# Altium footprint library 传感器和模块.PcbLib: 24 footprints (part 1 of 2)
Each footprint in its own frame and in the unit in brackets; x right, y up, seen from the top. Pads: shape width x height; smd on the part's side, far side on the other; paste and mask are expansions set on the pad; w line width, h text height; cw(c..) or ccw(c..) is an arc to the next point about the centre after c.
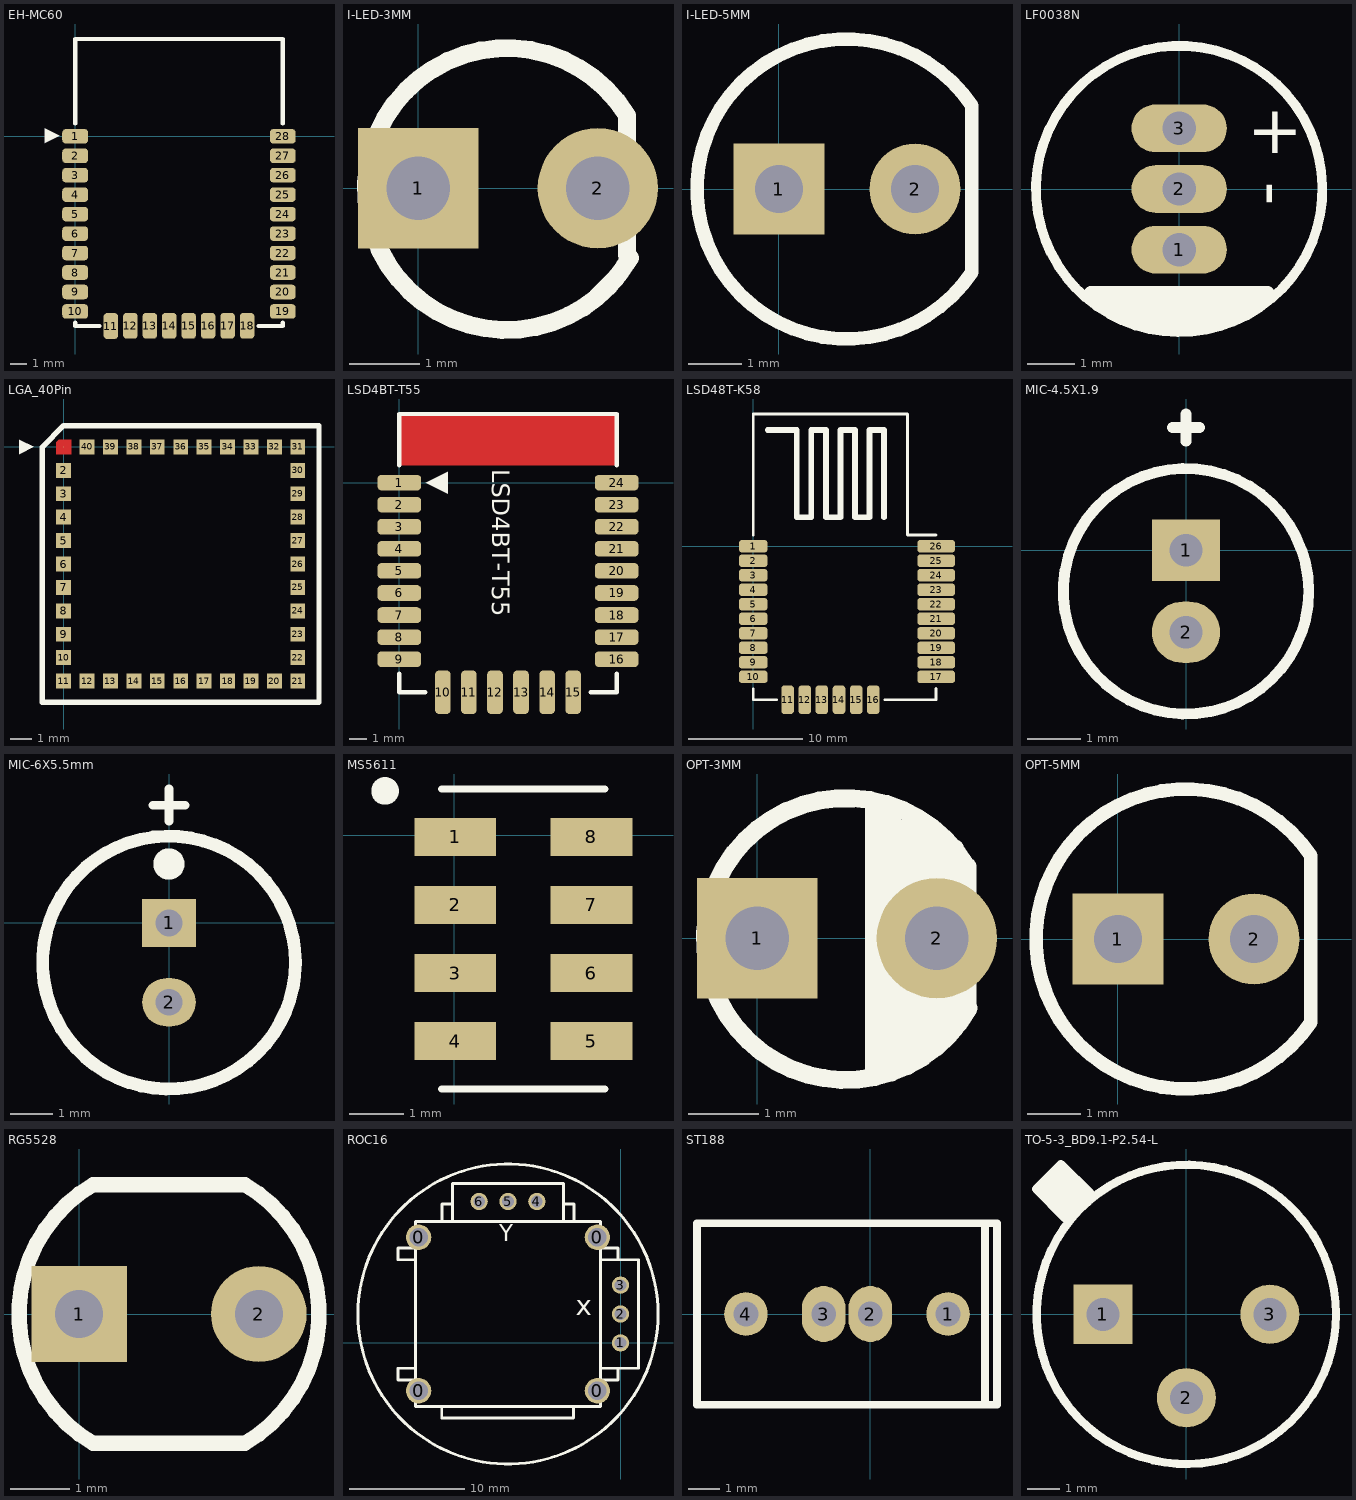
[diagram p0: the footprints below, top view; thin cyan lines are the x and y axes]

## EH-MC60 [mm]
pads (28):
  rrect50% 1.6x0.9 smd: 1(0,0) 2(0,-1.2) 3(0,-2.4) 4(0,-3.6) 5(0,-4.8) 6(0,-6) 7(0,-7.2) 8(0,-8.4) 9(0,-9.6) 10(0,-10.8) 19(12.8,-10.8) 20(12.8,-9.6) 21(12.8,-8.4) 22(12.8,-7.2) 23(12.8,-6) 24(12.8,-4.8) 25(12.8,-3.6) 26(12.8,-2.4) 27(12.8,-1.2) 28(12.8,0)
  rrect50% 0.9x1.6 smd: 11(2.2,-11.7) 12(3.4,-11.684) 13(4.6,-11.684) 14(5.8,-11.684) 15(7,-11.684) 16(8.2,-11.684) 17(9.4,-11.684) 18(10.6,-11.684)
Top Overlay:
  lines w0.254: 0,-11.5 0,-11.7 1.5,-11.7 ; 0,0.8 0,6 12.8,6 12.8,0.8 ; 11.3,-11.7 12.8,-11.7 12.8,-11.5
  text "▲" at -2.032,0.508 h1.52

## I-LED-3MM [mm]
pads (2):
  rect 1.7x1.7 hole 0.9: 1(0,0)
  round 1.7 hole 0.9: 2(2.54,0)
Top Overlay:
  lines w0.254: 2.54,-1.524 2.794,-1.27 ; 2.955,-0.947 2.955,1.025 ccw(c1.254,-0.012) 2.992,-0.985

## I-LED-5MM [mm]
pads (2):
  rect 1.7x1.7 hole 0.9: 1(0,0)
  round 1.7 hole 0.9: 2(2.54,0)
Top Overlay:
  lines w0.254: 3.6,-1.553 cw(c1.27,0) 3.6,1.553 3.6,-1.553

## LF0038N [mm] "脚距1.27mm"
pads (3):
  oval 2x1 hole 0.7: 1(0,-1.27) 2(0,0) 3(0,1.27)
Top Overlay:
  lines w0.203: 1.66,-2.499 cw(c0,0) 1.69,-2.479
  lines w0.254: -1.854,-2.311 1.854,-2.311 1.854,-2.159 -1.854,-2.159 -1.854,-2.311 ; -1.6,-2.489 1.524,-2.489 1.524,-2.413 -1.6,-2.413 -1.6,-2.489 ; -1.194,-2.667 1.194,-2.667 1.194,-2.616 -1.194,-2.616 -1.194,-2.667 ; -0.762,-2.819 0.711,-2.819 0.711,-2.743 -0.762,-2.743 -0.762,-2.819
  text "-" at 2.269,-0.356 h1.02
  text "+" at 1.422,0.745 h1.02

## LGA_40Pin [mm]
pads (41):
  round 0.025 smd: 1(0,0)
  rect 0.7x0.7 smd: 2(0,-1.1) 3(0,-2.2) 4(0,-3.3) 5(0,-4.4) 6(0,-5.5) 7(0,-6.6) 8(0,-7.7) 9(0,-8.8) 10(0,-9.9) 11(0,-11) 12(1.1,-11) 13(2.2,-11) 14(3.3,-11) 15(4.4,-11) 16(5.5,-11) 17(6.6,-11) 18(7.7,-11) 19(8.8,-11) 20(9.9,-11) 21(11,-11) 22(11,-9.9) 23(11,-8.8) 24(11,-7.7) 25(11,-6.6) 26(11,-5.5) 27(11,-4.4) 28(11,-3.3) 29(11,-2.2) 30(11,-1.1) 31(11,0) 32(9.9,0) 33(8.8,0) 34(7.7,0) 35(6.6,0) 36(5.5,0) 37(4.4,0) 38(3.3,0) 39(2.2,0) 40(1.1,0)
  round 0.025 on Top Overlay mask+0.102: ""(-1.75,0)
Top Layer:
  region: -0.35,-0.35 -0.35,0.225 -0.225,0.35 0.35,0.35 0.35,-0.35
Top Overlay:
  region: -2.1,0.35 -2.1,-0.35 -1.4,0
  lines w0.254: -1,-12 -1,0 0,1 12,1 12,-12 -1,-12

## LSD4BT-T55 [mm]
pads (24):
  rrect50% 2.5x0.9 smd: 1(0,0) 2(0,-1.27) 3(0,-2.54) 4(0,-3.81) 5(0,-5.08) 6(0,-6.35) 7(0,-7.62) 8(0,-8.89) 9(0,-10.16) 16(12.5,-10.16) 17(12.5,-8.89) 18(12.5,-7.62) 19(12.5,-6.35) 20(12.5,-5.08) 21(12.5,-3.81) 22(12.5,-2.54) 23(12.5,-1.27) 24(12.5,0)
  rrect50% 0.9x2.5 smd: 10(2.5,-12.06) 11(4,-12.06) 12(5.5,-12.06) 13(7,-12.06) 14(8.5,-12.06) 15(10,-12.06)
Top Layer:
  pour cut-out: 0,3.945 0,1 12.5,1 12.5,3.945
Top Overlay:
  region: 1.524,0 2.794,-0.635 2.794,0.635
  lines w0.254: 0,-11 0,-12.06 1.5,-12.06 ; 0,1 0,3.945 12.5,3.945 12.5,1 ; 11,-12.055 12.5,-12.055 12.5,-11
  text "." at -1.524,0.508 h1.02
  text "LSD4BT-T55" at 5.334,0.762 h1.02

## LSD48T-K58 [mm]
pads (26):
  rrect50% 2.5x1.1 smd: 1(0,0) 2(0,-1.27) 3(0,-2.54) 4(0,-3.81) 5(0,-5.08) 6(0,-6.35) 7(0,-7.62) 8(0,-8.89) 9(0,-10.16) 10(0,-11.43)
  rrect50% 1.1x2.5 smd: 11(3,-13.43) 12(4.5,-13.43) 13(6,-13.43) 14(7.5,-13.43) 15(9,-13.43) 16(10.5,-13.43)
  rrect50% 3.3x1.1 smd: 17(16,-11.43) 18(16,-10.16) 19(16,-8.89) 20(16,-7.62) 21(16,-6.35) 22(16,-5.08) 23(16,-3.81) 24(16,-2.54) 25(16,-1.27) 26(16,0)
Top Overlay:
  lines w0.254: 0,-12.5 0,-13.43 2.032,-13.43 ; 0,1 0,11.57 13.5,11.57 13.5,1 16,1 ; 11.5,-13.43 16,-13.43 16,-12.448
  lines w0.508: 1.27,10.16 3.81,10.16 3.81,2.54 5.08,2.54 5.08,10.16 6.35,10.16 6.35,2.54 7.62,2.54 7.62,10.16 8.89,10.16 8.89,2.54 10.16,2.54 10.16,10.16 11.43,10.16 11.43,2.54

## MIC-4.5X1.9 [mil]
pads (2):
  rect 50x45 hole 24: 1(0,0)
  oval 50x45 hole 24: 2(0,-60)
Top Overlay:
  circle w8: c0,-30 r90
  lines w8: -10,90 10,90 ; 0,80 0,100
3D body "MIC4.5X1.9.STEP": height 75.38, standoff -110.24, extent -88.58,-117.17 88.58,60

## MIC-6X5.5mm [mil]
pads (2):
  rect 50x45 hole 25: 1(0,0)
  oval 50x45 hole 25: 2(0,-74)
Top Overlay:
  circle w12: c0,-37 r118
  circle w15: c0,55 r7.07
  lines w8: -15,110 15,110 ; 0,95 0,125
3D body "MIC6X5.5.STEP": height 197.64, standoff -118.11, extent -120,-153.11 116.22,83.11

## MS5611 [mm]
pads (8):
  rect 1.5x0.7 smd: 1(0.02,-0.03) 2(0.02,-1.28) 3(0.02,-2.53) 4(0.02,-3.78) 5(2.52,-3.78) 6(2.52,-2.53) 7(2.52,-1.28) 8(2.52,-0.03)
Top Overlay:
  circle w0.454: c-1.27,0.813 r0.025
  lines w0.127: -0.23,-4.659 2.77,-4.659 ; -0.23,0.849 2.77,0.849
3D body "SM5611-.STEP": height 1, standoff -0.01, extent -0.23,-4.492 2.77,0.508

## OPT-3MM [mm]
pads (2):
  rect 1.7x1.7 hole 0.9: 1(0,0)
  round 1.7 hole 0.9: 2(2.54,0)
Top Overlay:
  lines w0.254: 1.651,-1.905 1.651,1.905 ; 1.905,-1.778 1.905,1.778 ; 2.286,-1.651 2.286,1.524 ; 2.794,1.27 2.794,-1.27 2.54,-1.524 2.54,1.397 2.413,1.524 2.286,1.524 ; 2.955,1.025 ccw(c1.254,-0.012) 2.99,-0.987 ; 2.972,-0.965 2.972,1.016 ; 2.159,1.651 2.159,-1.778 2.159,1.651 ; 2.159,1.651 2.286,1.524

## OPT-5MM [mm]
pads (2):
  rect 1.7x1.7 hole 0.9: 1(0,0)
  round 1.7 hole 0.9: 2(2.54,0)
Top Overlay:
  lines w0.254: 3.6,-1.553 cw(c1.27,0) 3.6,1.553 3.6,-1.553

## RG5528 [mm]
pads (2):
  rect 1.6x1.6 hole 0.8: 1(0,0)
  round 1.6 hole 0.8: 2(3,0)
Top Overlay:
  lines w0.254: 0.23,-2.159 cw(c1.5,0) 0.23,2.159 2.77,2.159 cw(c1.5,0) 2.77,-2.159 0.23,-2.159
3D body "RG5528-.STEP": height 1.9, standoff -3.45, extent -1,-2.159 4,2.141

## ROC16 [mm]
pads (10):
  round 2.2 hole 1.6: 0(-17.5,-4.15) 0(-17.5,9.15) 0(-2,-4.15) 0(-2,9.15)
  round 1.5 hole 1: 1(0,0) 2(0,2.5) 3(0,5) 4(-7.25,12.25) 5(-9.75,12.25) 6(-12.25,12.25)
Top Overlay:
  circle w0.254: c-9.75,2.5 r13
  lines w0.254: -17.75,-3.215 -19.275,-3.215 -19.275,-2.199 -17.75,-2.199 ; -17.75,7.199 -19.275,7.199 -19.275,8.215 -17.75,8.215 ; -15.491,-5.528 -15.491,-6.517 -4.061,-6.517 -4.061,-5.527 -4.087,-5.553 ; -15.465,10.5 -15.465,12.025 -14.55,12.025 ; -14.55,10.5 -14.55,13.8 -4.95,13.8 -4.95,10.5 ; -4.95,11.644 -4.95,10.5 ; -4.95,12.025 -4.035,12.025 -4.035,10.5 ; -4.924,10.526 -4.95,10.5 ; -1.75,-3.215 -0.225,-3.215 -0.225,-2.199 ; -1.75,-2.199 -0.225,-2.199 ; -1.75,7.199 -0.225,7.199 ; -1.75,8.215 -0.225,8.215 -0.225,7.199 ; -0.225,-2.199 1.55,-2.199 1.551,0.075 ; -0.225,7.199 1.553,7.199 1.552,4.824 1.551,0.075 ; 1.551,0.075 1.551,0.075 ; -17.75,-5.5 -17.75,10.5 -1.75,10.5 -1.75,-5.5 -17.75,-5.5
  text "Y" at -10.512,8.342 h2.5
  text "x" at -3.883,1.763 h3
3D body "ROC16-.STEP": height 29.36, standoff -3.65, extent -22.25,-10.054 2.75,14.946

## ST188 [mm]
pads (4):
  round 1.4 hole 0.8: 1(2.5,0) 4(-4,0)
  oval 1.4x1.8 hole 0.8: 2(0,0) 3(-1.5,0)
Top Overlay:
  lines w0.254: 3.695,-2.921 3.695,2.921 ; -5.576,-2.921 -5.576,2.921 4.076,2.921 4.076,-2.921 -5.576,-2.921
3D body "ST188-.STEP": height 8.2, standoff -3.5, extent -5.449,-2.75 3.951,2.75

## TO-5-3_BD9.1-P2.54-L [mm]
pads (3):
  rect 1.8x1.8 hole 1: 1(-2.54,0)
  round 1.8 hole 1: 2(0,-2.54) 3(2.54,0)
Top Overlay:
  circle w0.254: c0,0 r4.552
  region: -2.794,3.556 -2.802,3.556 -3.818,4.572 -3.818,4.569 -4.575,3.813 -4.575,3.812 -3.556,2.794
  lines w0.254: -3.688,2.916 -4.575,3.813 -3.818,4.572 -2.921,3.683
Mechanical 15:
  region: -2.794,3.556 -2.802,3.556 -3.818,4.572 -3.818,4.569 -4.575,3.813 -4.575,3.812 -3.556,2.794